# Altium footprint library TimeCard-NIC-V1.PcbLib: 104 footprints (part 2 of 7)
Each footprint in its own frame and in the unit in brackets; x right, y up, seen from the top. Pads: shape width x height; smd on the part's side, far side on the other; paste and mask are expansions set on the pad; w line width, h text height; cw(c..) or ccw(c..) is an arc to the next point about the centre after c.
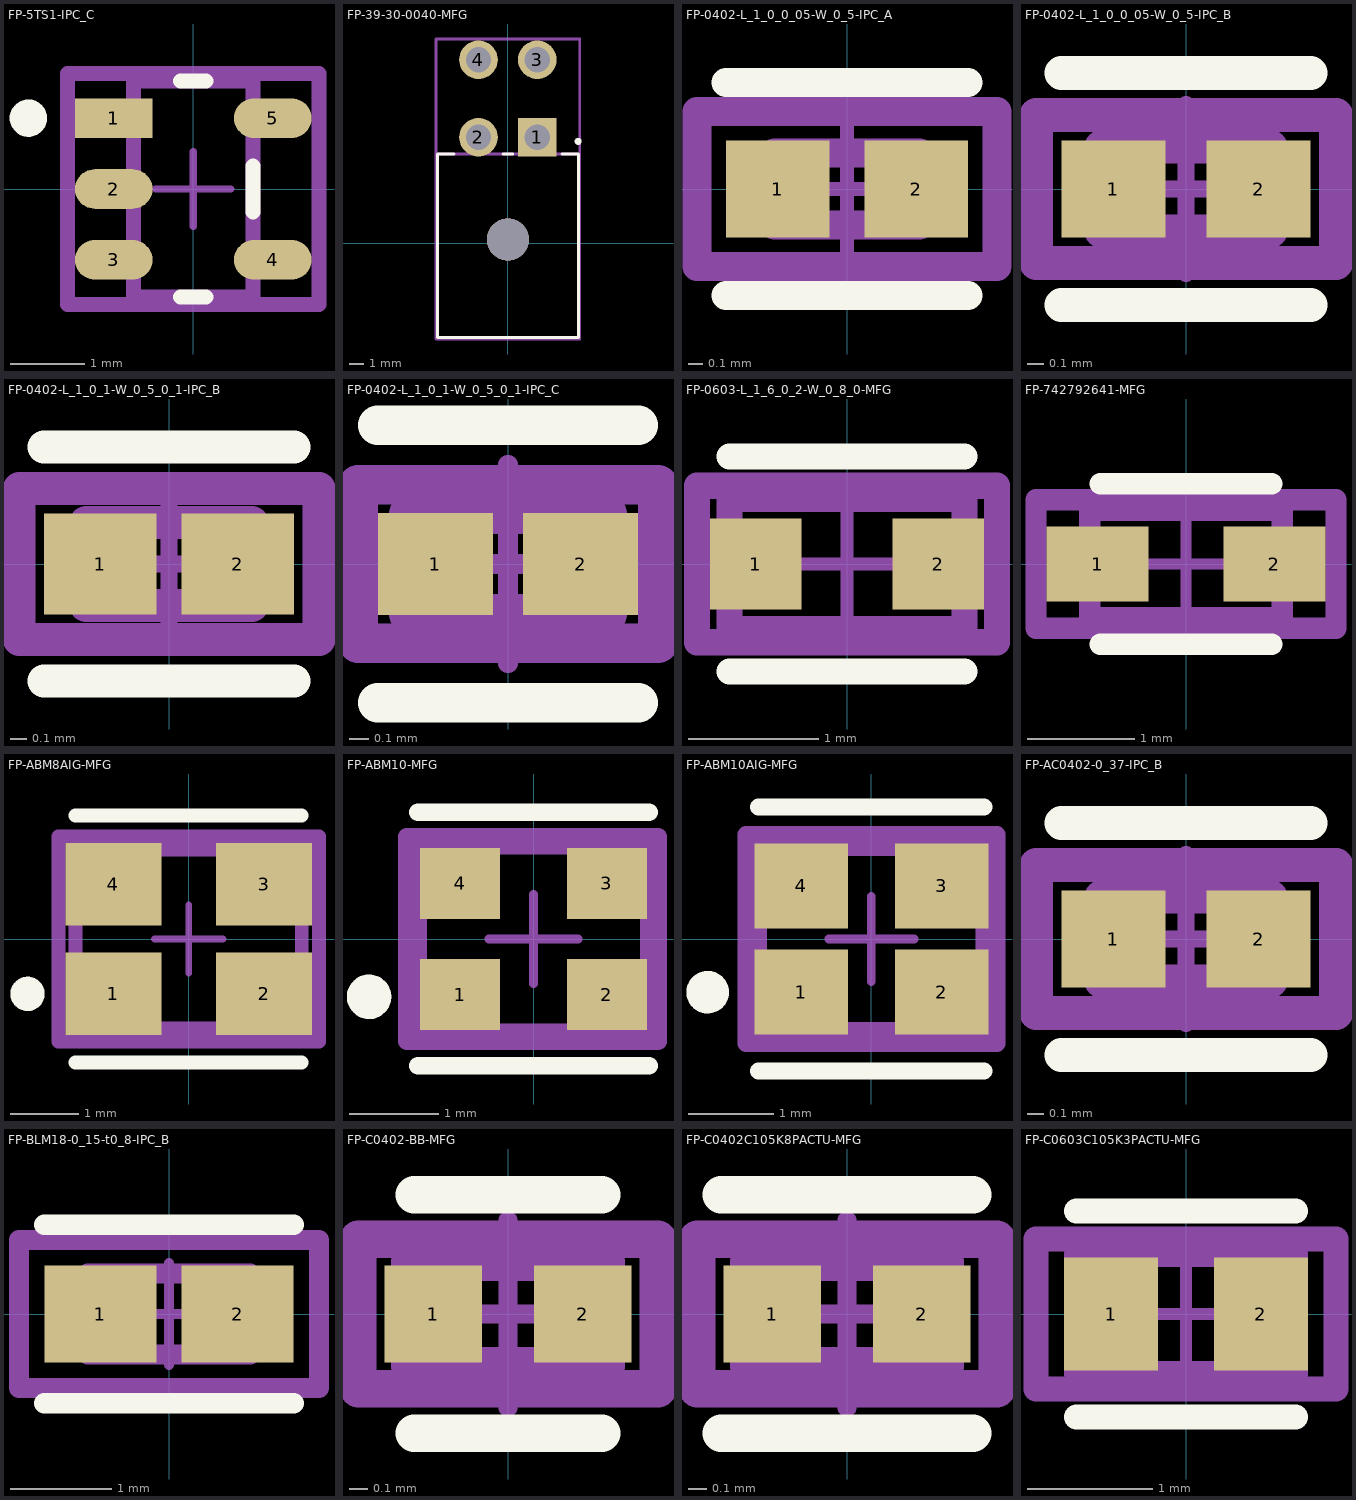
[diagram p1: the footprints below, top view; thin cyan lines are the x and y axes]

## FP-5TS1-IPC_C [mm]
pads (5):
  rect 1.038x0.532 smd paste+0 mask+0: 1(-1.066,0.95)
  rrect100% 1.038x0.532 smd paste+0 mask+0: 2(-1.066,0) 3(-1.066,-0.95) 4(1.066,-0.95) 5(1.066,0.95)
Top Overlay:
  circle w0.25: c-2.21,0.95 r0.125
  lines w0.2: -0.172,-1.45 0.172,-1.45 ; -0.172,1.45 0.172,1.45 ; 0.8,-0.309 0.8,0.309
Top 3D Body:
  lines w0.2: -0.8,-1.45 0.8,-1.45 0.8,1.45 -0.8,1.45 -0.8,-1.45
Top Courtyard:
  lines w0.2: -1.685,-1.55 1.685,-1.55 1.685,1.55 -1.685,1.55 -1.685,-1.55
Top Assembly:
  lines w0.2: -1.685,-1.55 1.685,-1.55 1.685,1.55 -1.685,1.55 -1.685,-1.55
  text ".Designator" at 0,-0.001 h1
Top Component Center:
  lines w0.1: -0.5,0 0.5,0 ; 0,-0.5 0,0.5
3D body "IC_Microchip_AT24MAC402-STUM-T_eec.STEP": height 0.25, standoff 0, extent -1.685,-1.55 1.685,1.55

## FP-39-30-0040-MFG [mm]
pads (5):
  rect 2.75x2.75 hole 1.8 paste-1000 mask+0: 1(2.095,7.544)
  round 2.75 hole 1.8 paste-1000 mask+0: 2(-2.095,7.544) 3(2.095,13.056) 4(-2.095,13.056)
  round 2.997 hole 2.997 unplated paste-1000 mask+0: ""(0,0.254)
Top Overlay:
  circle w0.25: c5.005,7.244 r0.125
  lines w0.2: -3.845,6.35 -5.016,6.35 -5.016,-6.731 5.016,-6.731 5.016,6.35 3.845,6.35 ; -0.346,6.35 0.346,6.35
Top 3D Body:
  lines w0.2: -5.016,-6.731 -5.016,6.35 5.016,6.35 5.016,-6.731 -5.016,-6.731
Top Courtyard:
  lines w0.2: -5.116,-6.831 -5.116,14.531 5.116,14.531 5.116,-6.831 -5.116,-6.831
Top Assembly:
  lines w0.2: -5.116,-6.831 -5.116,14.531 5.116,14.531 5.116,-6.831 -5.116,-6.831
  text ".Designator" at 0,3.849 h1
Top Component Center:
  lines w0.1: -0.5,0 0.5,0 ; 0,-0.5 0,0.5
3D body "Conn_Molex_39-30-0040_eec.STEP": height 0.25, standoff 0, extent -5.116,-6.831 5.116,14.531

## FP-0402-L_1_0_0_05-W_0_5-IPC_A [mm]
height 10.85
pads (2):
  rect 0.715x0.672 smd paste+0 mask+0: 1(-0.479,0) 2(0.479,0)
Top Overlay:
  lines w0.2: -0.836,-0.736 0.836,-0.736 ; -0.836,0.736 0.836,0.736
Top 3D Body:
  lines w0.2: -0.5,-0.25 0.5,-0.25 0.5,0.25 -0.5,0.25 -0.5,-0.25
Top Courtyard:
  lines w0.2: -1.036,-0.536 1.036,-0.536 1.036,0.536 -1.036,0.536 -1.036,-0.536
Top Assembly:
  lines w0.2: -1.036,-0.536 1.036,-0.536 1.036,0.536 -1.036,0.536 -1.036,-0.536
  text ".Designator" at 0,0.188 h1
Top Component Center:
  lines w0.1: -0.5,0 0.5,0 ; 0,-0.5 0,0.5
3D body "Cap_Taiyo_Yuden_QVS105CG0R9BVHF_eec.STEP": height 0.25, standoff 0, extent -1.036,-0.536 1.036,0.536

## FP-0402-L_1_0_0_05-W_0_5-IPC_B [mm]
height 10.85
pads (2):
  rect 0.615x0.572 smd paste+0 mask+0: 1(-0.429,0) 2(0.429,0)
Top Overlay:
  lines w0.2: -0.736,-0.686 0.736,-0.686 ; -0.736,0.686 0.736,0.686
Top 3D Body:
  lines w0.2: -0.5,-0.25 0.5,-0.25 0.5,0.25 -0.5,0.25 -0.5,-0.25
Top Courtyard:
  lines w0.2: -0.886,-0.436 0.886,-0.436 0.886,0.436 -0.886,0.436 -0.886,-0.436
Top Assembly:
  lines w0.2: -0.886,-0.436 0.886,-0.436 0.886,0.436 -0.886,0.436 -0.886,-0.436
  text ".Designator" at 0,0.188 h1
Top Component Center:
  lines w0.1: -0.5,0 0.5,0 ; 0,-0.5 0,0.5
3D body "Cap_Taiyo_Yuden_QVS105CG0R9BVHF_eec.STEP": height 0.25, standoff 0, extent -0.886,-0.436 0.886,0.436

## FP-0402-L_1_0_1-W_0_5_0_1-IPC_B [mm]
height 10.85
pads (2):
  rect 0.681x0.612 smd paste+0 mask+0: 1(-0.416,0) 2(0.416,0)
Top Overlay:
  lines w0.2: -0.756,-0.706 0.756,-0.706 ; -0.756,0.706 0.756,0.706
Top 3D Body:
  lines w0.2: -0.5,-0.25 0.5,-0.25 0.5,0.25 -0.5,0.25 -0.5,-0.25
Top Courtyard:
  lines w0.2: -0.906,-0.456 0.906,-0.456 0.906,0.456 -0.906,0.456 -0.906,-0.456
Top Assembly:
  lines w0.2: -0.906,-0.456 0.906,-0.456 0.906,0.456 -0.906,0.456 -0.906,-0.456
  text ".Designator" at 0,0.188 h1
Top Component Center:
  lines w0.1: -0.5,0 0.5,0 ; 0,-0.5 0,0.5
3D body "Cap_AVX_04025C472KAT2A_eec.STEP": height 0.25, standoff 0, extent -0.906,-0.456 0.906,0.456

## FP-0402-L_1_0_1-W_0_5_0_1-IPC_C [mm]
height 10.85
pads (2):
  rect 0.581x0.512 smd paste+0 mask+0: 1(-0.366,0) 2(0.366,0)
Top Overlay:
  lines w0.2: -0.656,-0.7 0.656,-0.7 ; -0.656,0.7 0.656,0.7
Top 3D Body:
  lines w0.2: -0.5,-0.25 0.5,-0.25 0.5,0.25 -0.5,0.25 -0.5,-0.25
Top Courtyard:
  lines w0.2: -0.756,-0.4 0.756,-0.4 0.756,0.4 -0.756,0.4 -0.756,-0.4
Top Assembly:
  lines w0.2: -0.756,-0.4 0.756,-0.4 0.756,0.4 -0.756,0.4 -0.756,-0.4
  text ".Designator" at 0,0.188 h1
Top Component Center:
  lines w0.1: -0.5,0 0.5,0 ; 0,-0.5 0,0.5
3D body "Cap_AVX_04025C472KAT2A_eec.STEP": height 0.25, standoff 0, extent -0.756,-0.4 0.756,0.4

## FP-0603-L_1_6_0_2-W_0_8_0-MFG [mm]
height 10.85
pads (2):
  rect 0.7x0.7 smd paste+0 mask+0: 1(-0.7,0) 2(0.7,0)
Top Overlay:
  lines w0.2: -0.9,-0.825 0.9,-0.825 ; -0.9,0.825 0.9,0.825
Top 3D Body:
  lines w0.2: -0.9,-0.5 0.9,-0.5 0.9,0.5 -0.9,0.5 -0.9,-0.5
Top Courtyard:
  lines w0.2: -1.15,-0.6 1.15,-0.6 1.15,0.6 -1.15,0.6 -1.15,-0.6
Top Assembly:
  lines w0.2: -1.15,-0.6 1.15,-0.6 1.15,0.6 -1.15,0.6 -1.15,-0.6
  text ".Designator" at 0,0.188 h1
Top Component Center:
  lines w0.1: -0.5,0 0.5,0 ; 0,-0.5 0,0.5
3D body "Cap_Taiyo_Yuden_AMK107BBJ476MA-RE_eec.STEP": height 0.25, standoff 0, extent -1.15,-0.6 1.15,0.6

## FP-742792641-MFG [mm]
height 10.85
pads (2):
  rect 0.95x0.7 smd paste+0 mask+0: 1(-0.825,0) 2(0.825,0)
Top Overlay:
  lines w0.2: -0.8,-0.75 0.8,-0.75 ; -0.8,0.75 0.8,0.75
Top 3D Body:
  lines w0.2: -0.9,-0.5 0.9,-0.5 0.9,0.5 -0.9,0.5 -0.9,-0.5
Top Courtyard:
  lines w0.2: -1.4,-0.6 1.4,-0.6 1.4,0.6 -1.4,0.6 -1.4,-0.6
Top Assembly:
  lines w0.2: -1.4,-0.6 1.4,-0.6 1.4,0.6 -1.4,0.6 -1.4,-0.6
  text ".Designator" at 0,0.188 h1
Top Component Center:
  lines w0.1: -0.5,0 0.5,0 ; 0,-0.5 0,0.5
3D body "FBead_Wurth_742792641_eec.STEP": height 0.25, standoff 0, extent -1.4,-0.6 1.4,0.6

## FP-ABM8AIG-MFG [mm]
height 10.85
pads (4):
  rect 1.4x1.2 smd paste+0 mask+0: 1(-1.1,-0.8) 2(1.1,-0.8) 3(1.1,0.8) 4(-1.1,0.8)
Top Overlay:
  circle w0.25: c-2.35,-0.8 r0.125
  lines w0.2: -1.65,-1.8 1.65,-1.8 ; -1.65,1.8 1.65,1.8
Top 3D Body:
  lines w0.2: -1.65,-1.3 1.65,-1.3 1.65,1.3 -1.65,1.3 -1.65,-1.3
Top Courtyard:
  lines w0.2: -1.9,-1.5 1.9,-1.5 1.9,1.5 -1.9,1.5 -1.9,-1.5
Top Assembly:
  lines w0.2: -1.9,-1.5 1.9,-1.5 1.9,1.5 -1.9,1.5 -1.9,-1.5
  text ".Designator" at 0,0.188 h1
Top Component Center:
  lines w0.1: -0.5,0 0.5,0 ; 0,-0.5 0,0.5
3D body "Crys_Abracon_ABM8AIG-20_000MHZ-12-2Z-T3_eec.STEP": height 0.25, standoff 0, extent -1.9,-1.5 1.9,1.5

## FP-ABM10-MFG [mm]
height 10.85
pads (4):
  rect 0.9x0.8 smd paste+0 mask+0: 1(-0.825,-0.625) 2(0.825,-0.625) 3(0.825,0.625) 4(-0.825,0.625)
Top Overlay:
  circle w0.25: c-1.85,-0.65 r0.125
  lines w0.2: -1.3,-1.425 1.3,-1.425 ; -1.3,1.425 1.3,1.425
Top 3D Body:
  lines w0.2: -1.3,-1.05 1.3,-1.05 1.3,1.05 -1.3,1.05 -1.3,-1.05
Top Courtyard:
  lines w0.2: -1.422,-1.15 1.4,-1.15 1.4,1.15 -1.422,1.15 -1.422,-1.15
Top Assembly:
  lines w0.2: -1.422,-1.15 1.4,-1.15 1.4,1.15 -1.422,1.15 -1.422,-1.15
  text ".Designator" at -0.011,0.188 h1
Top Component Center:
  lines w0.1: -0.5,0 0.5,0 ; 0,-0.5 0,0.5
3D body "Crys_Abracon_ABM10-16_000MHZ-D30-T3_eec.STEP": height 0.25, standoff 0, extent -1.422,-1.15 1.4,1.15

## FP-ABM10AIG-MFG [mm]
height 10.85
pads (4):
  rect 1.1x1 smd paste+0 mask+0: 1(-0.825,-0.625) 2(0.825,-0.625) 3(0.825,0.625) 4(-0.825,0.625)
Top Overlay:
  circle w0.25: c-1.925,-0.625 r0.125
  lines w0.2: -1.325,-1.55 1.325,-1.55 ; -1.325,1.55 1.325,1.55
Top 3D Body:
  lines w0.2: -1.325,-1.075 1.325,-1.075 1.325,1.075 -1.325,1.075 -1.325,-1.075
Top Courtyard:
  lines w0.2: -1.475,-1.225 1.475,-1.225 1.475,1.225 -1.475,1.225 -1.475,-1.225
Top Assembly:
  lines w0.2: -1.475,-1.225 1.475,-1.225 1.475,1.225 -1.475,1.225 -1.475,-1.225
  text ".Designator" at 0,0.188 h1
Top Component Center:
  lines w0.1: -0.5,0 0.5,0 ; 0,-0.5 0,0.5
3D body "Crys_Abracon_ABM10AIG-24_000MHZ-4-T3_eec.STEP": height 0.25, standoff 0, extent -1.475,-1.225 1.475,1.225

## FP-AC0402-0_37-IPC_B [mm]
height 10.85
pads (2):
  rect 0.615x0.572 smd paste+0 mask+0: 1(-0.429,0) 2(0.429,0)
Top Overlay:
  lines w0.2: -0.736,-0.686 0.736,-0.686 ; -0.736,0.686 0.736,0.686
Top 3D Body:
  lines w0.2: -0.5,-0.25 0.5,-0.25 0.5,0.25 -0.5,0.25 -0.5,-0.25
Top Courtyard:
  lines w0.2: -0.886,-0.436 0.886,-0.436 0.886,0.436 -0.886,0.436 -0.886,-0.436
Top Assembly:
  lines w0.2: -0.886,-0.436 0.886,-0.436 0.886,0.436 -0.886,0.436 -0.886,-0.436
  text ".Designator" at 0,0.188 h1
Top Component Center:
  lines w0.1: -0.5,0 0.5,0 ; 0,-0.5 0,0.5
3D body "Res_Yageo_AC0402FR-072K61L_eec.STEP": height 0.25, standoff 0, extent -0.886,-0.436 0.886,0.436

## FP-BLM18-0_15-t0_8-IPC_B [mm]
height 10.85
pads (2):
  rect 1.106x0.958 smd paste+0 mask+0: 1(-0.676,0) 2(0.676,0)
Top Overlay:
  lines w0.2: -1.229,-0.879 1.229,-0.879 ; -1.229,0.879 1.229,0.879
Top 3D Body:
  lines w0.2: -0.8,-0.4 0.8,-0.4 0.8,0.4 -0.8,0.4 -0.8,-0.4
Top Courtyard:
  lines w0.2: -1.479,-0.729 1.479,-0.729 1.479,0.729 -1.479,0.729 -1.479,-0.729
Top Assembly:
  lines w0.2: -1.479,-0.729 1.479,-0.729 1.479,0.729 -1.479,0.729 -1.479,-0.729
  text ".Designator" at 0,0.188 h1
Top Component Center:
  lines w0.1: -0.5,0 0.5,0 ; 0,-0.5 0,0.5
3D body "FBead_Murata_BLM18EG221SN1D_eec.STEP": height 0.25, standoff 0, extent -1.479,-0.729 1.479,0.729

## FP-C0402-BB-MFG [mm]
height 10.85
pads (2):
  rect 0.52x0.52 smd paste+0 mask+0: 1(-0.4,0) 2(0.4,0)
Top Overlay:
  lines w0.2: -0.5,-0.635 0.5,-0.635 ; -0.5,0.635 0.5,0.635
Top 3D Body:
  lines w0.2: -0.525,-0.275 0.525,-0.275 0.525,0.275 -0.525,0.275 -0.525,-0.275
Top Courtyard:
  lines w0.2: -0.8,-0.4 0.8,-0.4 0.8,0.4 -0.8,0.4 -0.8,-0.4
Top Assembly:
  lines w0.2: -0.8,-0.4 0.8,-0.4 0.8,0.4 -0.8,0.4 -0.8,-0.4
  text ".Designator" at 0,0.188 h1
Top Component Center:
  lines w0.1: -0.5,0 0.5,0 ; 0,-0.5 0,0.5
3D body "Cap_Kemet_C0402C562J5RACTU_eec.STEP": height 0.25, standoff 0, extent -0.8,-0.4 0.8,0.4

## FP-C0402C105K8PACTU-MFG [mm]
pads (2):
  rect 0.52x0.52 smd paste+0 mask+0: 1(-0.4,0) 2(0.4,0)
Top Overlay:
  lines w0.2: -0.67,-0.635 0.67,-0.635 ; -0.67,0.635 0.67,0.635
Top 3D Body:
  lines w0.2: -0.525,-0.275 0.525,-0.275 0.525,0.275 -0.525,0.275 -0.525,-0.275
Top Courtyard:
  lines w0.2: -0.8,-0.4 0.8,-0.4 0.8,0.4 -0.8,0.4 -0.8,-0.4
Top Assembly:
  lines w0.2: -0.8,-0.4 0.8,-0.4 0.8,0.4 -0.8,0.4 -0.8,-0.4
  text ".Designator" at 0,0.188 h1
Top Component Center:
  lines w0.1: -0.5,0 0.5,0 ; 0,-0.5 0,0.5
3D body "Cap_Kemet_C0402C105K8PACTU_eec.STEP": height 0.55, standoff 0, extent -0.5,-0.25 0.5,0.25

## FP-C0603C105K3PACTU-MFG [mm]
height 1.7
pads (2):
  rect 0.75x0.9 smd paste+0 mask+0: 1(-0.6,0) 2(0.6,0)
Top Overlay:
  lines w0.2: -0.875,-0.825 0.875,-0.825 ; -0.875,0.825 0.875,0.825
Top 3D Body:
  lines w0.2: -0.875,-0.475 0.875,-0.475 0.875,0.475 -0.875,0.475 -0.875,-0.475
Top Courtyard:
  lines w0.2: -1.2,-0.6 1.2,-0.6 1.2,0.6 -1.2,0.6 -1.2,-0.6
Top Assembly:
  lines w0.2: -1.2,-0.6 1.2,-0.6 1.2,0.6 -1.2,0.6 -1.2,-0.6
Top Component Center:
  lines w0.1: -0.5,0 0.5,0 ; 0,-0.5 0,0.5
3D body "Cap_Kemet_C0603C105K3PACTU_eec.STEP": height 0.25, standoff 0, extent -1.2,-0.6 1.2,0.6